# Altium footprint library Package_DFN_QFN.PcbLib: 557 footprints (part 16 of 35)
Each footprint in its own frame and in the unit in brackets; x right, y up, seen from the top. Pads: shape width x height; smd on the part's side, far side on the other; paste and mask are expansions set on the pad; w line width, h text height; cw(c..) or ccw(c..) is an arc to the next point about the centre after c.
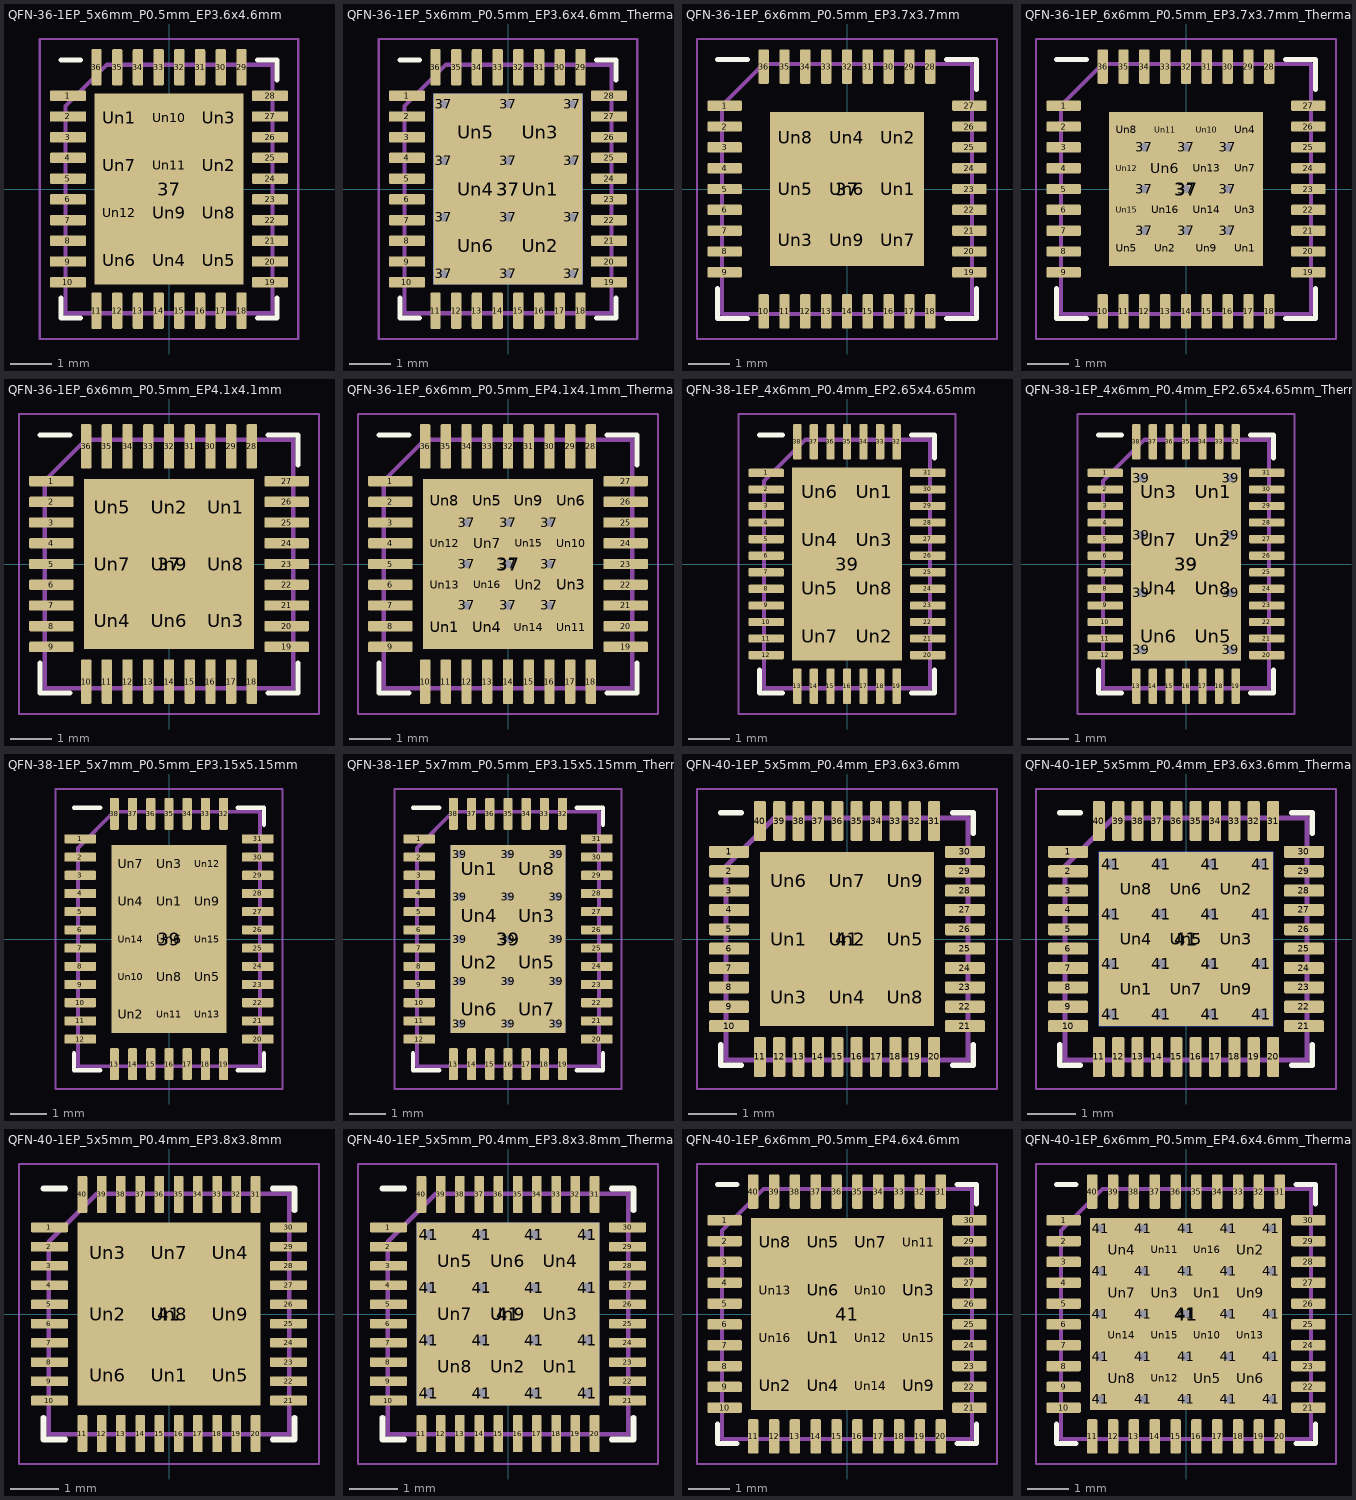
[diagram p15: the footprints below, top view; thin cyan lines are the x and y axes]

## QFN-36-1EP_5x6mm_P0.5mm_EP3.6x4.6mm [mm]
pads (49):
  rrect25% 0.875x0.25 smd: 1(-2.438,2.25) 2(-2.438,1.75) 3(-2.438,1.25) 4(-2.438,0.75) 5(-2.438,0.25) 6(-2.438,-0.25) 7(-2.438,-0.75) 8(-2.438,-1.25) 9(-2.438,-1.75) 10(-2.438,-2.25) 19(2.438,-2.25) 20(2.438,-1.75) 21(2.438,-1.25) 22(2.438,-0.75) 23(2.438,-0.25) 24(2.438,0.25) 25(2.438,0.75) 26(2.438,1.25) 27(2.438,1.75) 28(2.438,2.25)
  rrect25% 0.25x0.875 smd: 11(-1.75,-2.937) 12(-1.25,-2.937) 13(-0.75,-2.937) 14(-0.25,-2.937) 15(0.25,-2.937) 16(0.75,-2.937) 17(1.25,-2.937) 18(1.75,-2.937) 29(1.75,2.937) 30(1.25,2.937) 31(0.75,2.937) 32(0.25,2.937) 33(-0.25,2.937) 34(-0.75,2.937) 35(-1.25,2.937) 36(-1.75,2.937)
  rect 3.6x4.6 smd: 37(0,0)
  rrect25% 0.97x0.93 on Top Paste: Un1(-1.2,1.725) Un2(1.2,0.575) Un3(1.2,1.725) Un4(0,-1.725) Un5(1.2,-1.725) Un6(-1.2,-1.725) Un7(-1.2,0.575) Un8(1.2,-0.575) Un9(0,-0.575) Un10(0,1.725) Un11(0,0.575) Un12(-1.2,-0.575)
F.SilkS:
  lines w0.12: -2.61,-2.635 -2.61,-3.11 -2.135,-3.11 ; -2.61,3.11 -2.135,3.11 ; 2.135,-3.11 2.61,-3.11 2.61,-2.635 ; 2.135,3.11 2.61,3.11 2.61,2.635
F.CrtYd:
  lines w0.05: -3.12,-3.62 3.12,-3.62 3.12,3.62 -3.12,3.62 -3.12,-3.62
F.Fab:
  lines w0.1: -2.5,-3 2.5,-3 2.5,3 -1.5,3 -2.5,2 -2.5,-3
  text "'.Designator'" at -4.047,-0.84 h1

## QFN-36-1EP_5x6mm_P0.5mm_EP3.6x4.6mm_ThermalVias [mm]
pads (56):
  rrect25% 0.875x0.25 smd: 1(-2.438,2.25) 2(-2.438,1.75) 3(-2.438,1.25) 4(-2.438,0.75) 5(-2.438,0.25) 6(-2.438,-0.25) 7(-2.438,-0.75) 8(-2.438,-1.25) 9(-2.438,-1.75) 10(-2.438,-2.25) 19(2.438,-2.25) 20(2.438,-1.75) 21(2.438,-1.25) 22(2.438,-0.75) 23(2.438,-0.25) 24(2.438,0.25) 25(2.438,0.75) 26(2.438,1.25) 27(2.438,1.75) 28(2.438,2.25)
  rrect25% 0.25x0.875 smd: 11(-1.75,-2.937) 12(-1.25,-2.937) 13(-0.75,-2.937) 14(-0.25,-2.937) 15(0.25,-2.937) 16(0.75,-2.937) 17(1.25,-2.937) 18(1.75,-2.937) 29(1.75,2.937) 30(1.25,2.937) 31(0.75,2.937) 32(0.25,2.937) 33(-0.25,2.937) 34(-0.75,2.937) 35(-1.25,2.937) 36(-1.75,2.937)
  round 0.5 hole 0.2: 37(-1.55,-2.05) 37(-1.55,-0.683) 37(-1.55,0.683) 37(-1.55,2.05) 37(0,-2.05) 37(0,-0.683) 37(0,0.683) 37(0,2.05) 37(1.55,-2.05) 37(1.55,-0.683) 37(1.55,0.683) 37(1.55,2.05)
  rect 3.6x4.6 smd far side: 37(0,0)
  rect 3.6x4.6 smd: 37(0,0)
  rrect21% 1.394x1.188 on Top Paste: Un1(0.775,0) Un2(0.775,-1.367) Un3(0.775,1.367) Un4(-0.775,0) Un5(-0.775,1.367) Un6(-0.775,-1.367)
F.SilkS:
  lines w0.12: -2.61,-2.635 -2.61,-3.11 -2.135,-3.11 ; -2.61,3.11 -2.135,3.11 ; 2.135,-3.11 2.61,-3.11 2.61,-2.635 ; 2.135,3.11 2.61,3.11 2.61,2.635
F.CrtYd:
  lines w0.05: -3.12,-3.62 -3.12,3.62 3.12,3.62 3.12,-3.62 -3.12,-3.62
F.Fab:
  lines w0.1: -2.5,-3 -2.5,2 -1.5,3 2.5,3 2.5,-3 -2.5,-3
  text "'.Designator'" at -4.047,-0.84 h1

## QFN-36-1EP_6x6mm_P0.5mm_EP3.7x3.7mm [mm]
pads (46):
  rrect25% 0.825x0.25 smd: 1(-2.937,2) 2(-2.937,1.5) 3(-2.937,1) 4(-2.937,0.5) 5(-2.937,0) 6(-2.937,-0.5) 7(-2.937,-1) 8(-2.937,-1.5) 9(-2.937,-2) 19(2.937,-2) 20(2.937,-1.5) 21(2.937,-1) 22(2.937,-0.5) 23(2.937,0) 24(2.937,0.5) 25(2.937,1) 26(2.937,1.5) 27(2.937,2)
  rrect25% 0.25x0.825 smd: 10(-2,-2.937) 11(-1.5,-2.937) 12(-1,-2.937) 13(-0.5,-2.937) 14(0,-2.937) 15(0.5,-2.937) 16(1,-2.937) 17(1.5,-2.937) 18(2,-2.937) 28(2,2.937) 29(1.5,2.937) 30(1,2.937) 31(0.5,2.937) 32(0,2.937) 33(-0.5,2.937) 34(-1,2.937) 35(-1.5,2.937) 36(-2,2.937)
  rect 3.7x3.7 smd: 37(0,0)
  rrect25% 0.99x0.99 on Top Paste: Un1(1.23,0) Un2(1.23,1.23) Un3(-1.23,-1.23) Un4(0,1.23) Un5(-1.23,0) Un6(0,0) Un7(1.23,-1.23) Un8(-1.23,1.23) Un9(0,-1.23)
F.SilkS:
  lines w0.12: -3.11,-2.385 -3.11,-3.11 -2.385,-3.11 ; -3.11,3.11 -2.385,3.11 ; 2.385,-3.11 3.11,-3.11 3.11,-2.385 ; 2.385,3.11 3.11,3.11 3.11,2.385
F.CrtYd:
  lines w0.05: -3.6,-3.6 3.6,-3.6 3.6,3.6 -3.6,3.6 -3.6,-3.6
F.Fab:
  lines w0.1: -3,-3 -3,2 -2,3 3,3 3,-3 -3,-3
  text "'.Designator'" at -4.047,-0.84 h1

## QFN-36-1EP_6x6mm_P0.5mm_EP3.7x3.7mm_ThermalVias [mm]
pads (63):
  rrect25% 0.825x0.25 smd: 1(-2.937,2) 2(-2.937,1.5) 3(-2.937,1) 4(-2.937,0.5) 5(-2.937,0) 6(-2.937,-0.5) 7(-2.937,-1) 8(-2.937,-1.5) 9(-2.937,-2) 19(2.937,-2) 20(2.937,-1.5) 21(2.937,-1) 22(2.937,-0.5) 23(2.937,0) 24(2.937,0.5) 25(2.937,1) 26(2.937,1.5) 27(2.937,2)
  rrect25% 0.25x0.825 smd: 10(-2,-2.937) 11(-1.5,-2.937) 12(-1,-2.937) 13(-0.5,-2.937) 14(0,-2.937) 15(0.5,-2.937) 16(1,-2.937) 17(1.5,-2.937) 18(2,-2.937) 28(2,2.937) 29(1.5,2.937) 30(1,2.937) 31(0.5,2.937) 32(0,2.937) 33(-0.5,2.937) 34(-1,2.937) 35(-1.5,2.937) 36(-2,2.937)
  round 0.5 hole 0.2: 37(-1,-1) 37(-1,0) 37(-1,1) 37(0,-1) 37(0,0) 37(0,1) 37(1,-1) 37(1,0) 37(1,1)
  rect 3.7x3.7 smd: 37(0,0)
  rect 2.5x2.5 smd far side: 37(0,0)
  round 0.602 on Top Paste: Un1(1.425,-1.425) Un4(1.425,1.425) Un5(-1.425,-1.425) Un8(-1.425,1.425)
  round 0.612 on Top Paste: Un2(-0.5,-1.425) Un3(1.425,-0.5) Un7(1.425,0.5) Un9(0.5,-1.425) Un10(0.5,1.425) Un11(-0.5,1.425) Un12(-1.425,0.5) Un15(-1.425,-0.5)
  rrect25% 0.806x0.806 on Top Paste: Un6(-0.5,0.5) Un13(0.5,0.5) Un14(0.5,-0.5) Un16(-0.5,-0.5)
F.SilkS:
  lines w0.12: -3.11,-2.385 -3.11,-3.11 -2.385,-3.11 ; -3.11,3.11 -2.385,3.11 ; 2.385,-3.11 3.11,-3.11 3.11,-2.385 ; 2.385,3.11 3.11,3.11 3.11,2.385
F.Paste:
  region: 1.684,-1.684 1.166,-1.684 1.166,-1.235 1.235,-1.166 1.684,-1.166
  region: -0.17,-1.216 -0.17,-1.694 -0.83,-1.694 -0.83,-1.216 -0.769,-1.156 -0.231,-1.156
  region: 1.694,-0.83 1.216,-0.83 1.156,-0.769 1.156,-0.231 1.216,-0.17 1.694,-0.17
  region: 1.684,1.166 1.235,1.166 1.166,1.235 1.166,1.684 1.684,1.684
  region: -1.166,-1.235 -1.166,-1.684 -1.684,-1.684 -1.684,-1.166 -1.235,-1.166
  region: 1.694,0.17 1.216,0.17 1.156,0.231 1.156,0.769 1.216,0.83 1.694,0.83
  region: -1.166,1.235 -1.235,1.166 -1.684,1.166 -1.684,1.684 -1.166,1.684
  region: 0.83,-1.216 0.83,-1.694 0.17,-1.694 0.17,-1.216 0.231,-1.156 0.769,-1.156
  region: 0.83,1.216 0.769,1.156 0.231,1.156 0.17,1.216 0.17,1.694 0.83,1.694
  region: -0.17,1.216 -0.231,1.156 -0.769,1.156 -0.83,1.216 -0.83,1.694 -0.17,1.694
  region: -1.156,0.769 -1.156,0.231 -1.216,0.17 -1.694,0.17 -1.694,0.83 -1.216,0.83
  region: -1.156,-0.231 -1.156,-0.769 -1.216,-0.83 -1.694,-0.83 -1.694,-0.17 -1.216,-0.17
F.CrtYd:
  lines w0.05: -3.6,-3.6 -3.6,3.6 3.6,3.6 3.6,-3.6 -3.6,-3.6
F.Fab:
  lines w0.1: -3,-3 -3,2 -2,3 3,3 3,-3 -3,-3
  text "'.Designator'" at -4.047,-0.84 h1

## QFN-36-1EP_6x6mm_P0.5mm_EP4.1x4.1mm [mm]
pads (46):
  rrect25% 1.075x0.25 smd: 1(-2.838,2) 2(-2.838,1.5) 3(-2.838,1) 4(-2.838,0.5) 5(-2.838,0) 6(-2.838,-0.5) 7(-2.838,-1) 8(-2.838,-1.5) 9(-2.838,-2) 19(2.838,-2) 20(2.838,-1.5) 21(2.838,-1) 22(2.838,-0.5) 23(2.838,0) 24(2.838,0.5) 25(2.838,1) 26(2.838,1.5) 27(2.838,2)
  rrect25% 0.25x1.075 smd: 10(-2,-2.838) 11(-1.5,-2.838) 12(-1,-2.838) 13(-0.5,-2.838) 14(0,-2.838) 15(0.5,-2.838) 16(1,-2.838) 17(1.5,-2.838) 18(2,-2.838) 28(2,2.838) 29(1.5,2.838) 30(1,2.838) 31(0.5,2.838) 32(0,2.838) 33(-0.5,2.838) 34(-1,2.838) 35(-1.5,2.838) 36(-2,2.838)
  rect 4.1x4.1 smd: 37(0,0)
  rrect23% 1.1x1.1 on Top Paste: Un1(1.37,1.37) Un2(0,1.37) Un3(1.37,-1.37) Un4(-1.37,-1.37) Un5(-1.37,1.37) Un6(0,-1.37) Un7(-1.37,0) Un8(1.37,0) Un9(0,0)
F.SilkS:
  lines w0.12: -3.11,-2.385 -3.11,-3.11 -2.385,-3.11 ; -3.11,3.11 -2.385,3.11 ; 2.385,-3.11 3.11,-3.11 3.11,-2.385 ; 2.385,3.11 3.11,3.11 3.11,2.385
F.CrtYd:
  lines w0.05: -3.62,-3.62 3.62,-3.62 3.62,3.62 -3.62,3.62 -3.62,-3.62
F.Fab:
  lines w0.1: -3,-3 3,-3 3,3 -2,3 -3,2 -3,-3
  text "'.Designator'" at -4.047,-0.84 h1

## QFN-36-1EP_6x6mm_P0.5mm_EP4.1x4.1mm_ThermalVias [mm]
pads (63):
  rrect25% 1.075x0.25 smd: 1(-2.838,2) 2(-2.838,1.5) 3(-2.838,1) 4(-2.838,0.5) 5(-2.838,0) 6(-2.838,-0.5) 7(-2.838,-1) 8(-2.838,-1.5) 9(-2.838,-2) 19(2.838,-2) 20(2.838,-1.5) 21(2.838,-1) 22(2.838,-0.5) 23(2.838,0) 24(2.838,0.5) 25(2.838,1) 26(2.838,1.5) 27(2.838,2)
  rrect25% 0.25x1.075 smd: 10(-2,-2.838) 11(-1.5,-2.838) 12(-1,-2.838) 13(-0.5,-2.838) 14(0,-2.838) 15(0.5,-2.838) 16(1,-2.838) 17(1.5,-2.838) 18(2,-2.838) 28(2,2.838) 29(1.5,2.838) 30(1,2.838) 31(0.5,2.838) 32(0,2.838) 33(-0.5,2.838) 34(-1,2.838) 35(-1.5,2.838) 36(-2,2.838)
  round 0.5 hole 0.2: 37(-1,-1) 37(-1,0) 37(-1,1) 37(0,-1) 37(0,0) 37(0,1) 37(1,-1) 37(1,0) 37(1,1)
  rect 4.1x4.1 smd: 37(0,0)
  rect 2.5x2.5 smd far side: 37(0,0)
  rrect25% 0.847x0.847 on Top Paste: Un1(-1.525,-1.525) Un6(1.525,1.525) Un8(-1.525,1.525) Un11(1.525,-1.525)
  rrect25% 0.806x0.806 on Top Paste: Un2(0.5,-0.5) Un7(-0.5,0.5) Un15(0.5,0.5) Un16(-0.5,-0.5)
  rrect25% 0.847x0.806 on Top Paste: Un3(1.525,-0.5) Un10(1.525,0.5) Un12(-1.525,0.5) Un13(-1.525,-0.5)
  rrect25% 0.806x0.847 on Top Paste: Un4(-0.5,-1.525) Un5(-0.5,1.525) Un9(0.5,1.525) Un14(0.5,-1.525)
F.SilkS:
  lines w0.12: -3.11,-2.385 -3.11,-3.11 -2.385,-3.11 ; -3.11,3.11 -2.385,3.11 ; 2.385,-3.11 3.11,-3.11 3.11,-2.385 ; 2.385,3.11 3.11,3.11 3.11,2.385
F.CrtYd:
  lines w0.05: -3.62,-3.62 3.62,-3.62 3.62,3.62 -3.62,3.62 -3.62,-3.62
F.Fab:
  lines w0.1: -3,-3 3,-3 3,3 -2,3 -3,2 -3,-3
  text "'.Designator'" at -4.047,-0.84 h1

## QFN-38-1EP_4x6mm_P0.4mm_EP2.65x4.65mm [mm]
pads (47):
  rrect25% 0.85x0.2 smd: 1(-1.95,2.2) 2(-1.95,1.8) 3(-1.95,1.4) 4(-1.95,1) 5(-1.95,0.6) 6(-1.95,0.2) 7(-1.95,-0.2) 8(-1.95,-0.6) 9(-1.95,-1) 10(-1.95,-1.4) 11(-1.95,-1.8) 12(-1.95,-2.2) 20(1.95,-2.2) 21(1.95,-1.8) 22(1.95,-1.4) 23(1.95,-1) 24(1.95,-0.6) 25(1.95,-0.2) 26(1.95,0.2) 27(1.95,0.6) 28(1.95,1) 29(1.95,1.4) 30(1.95,1.8) 31(1.95,2.2)
  rrect25% 0.2x0.85 smd: 13(-1.2,-2.95) 14(-0.8,-2.95) 15(-0.4,-2.95) 16(0,-2.95) 17(0.4,-2.95) 18(0.8,-2.95) 19(1.2,-2.95) 32(1.2,2.95) 33(0.8,2.95) 34(0.4,2.95) 35(0,2.95) 36(-0.4,2.95) 37(-0.8,2.95) 38(-1.2,2.95)
  rect 2.65x4.65 smd: 39(0,0)
  rrect25% 1.07x0.94 on Top Paste: Un1(0.66,1.74) Un2(0.66,-1.74) Un3(0.66,0.58) Un4(-0.66,0.58) Un5(-0.66,-0.58) Un6(-0.66,1.74) Un7(-0.66,-1.74) Un8(0.66,-0.58)
F.SilkS:
  lines w0.12: -2.11,-2.56 -2.11,-3.11 -1.56,-3.11 ; -2.11,3.11 -1.56,3.11 ; 1.56,-3.11 2.11,-3.11 2.11,-2.56 ; 1.56,3.11 2.11,3.11 2.11,2.56
F.CrtYd:
  lines w0.05: -2.62,-3.62 2.62,-3.62 2.62,3.62 -2.62,3.62 -2.62,-3.62
F.Fab:
  lines w0.1: -2,-3 2,-3 2,3 -1,3 -2,2 -2,-3
  text "'.Designator'" at -4.047,-0.84 h1

## QFN-38-1EP_4x6mm_P0.4mm_EP2.65x4.65mm_ThermalVias [mm]
pads (56):
  rrect25% 0.85x0.2 smd: 1(-1.95,2.2) 2(-1.95,1.8) 3(-1.95,1.4) 4(-1.95,1) 5(-1.95,0.6) 6(-1.95,0.2) 7(-1.95,-0.2) 8(-1.95,-0.6) 9(-1.95,-1) 10(-1.95,-1.4) 11(-1.95,-1.8) 12(-1.95,-2.2) 20(1.95,-2.2) 21(1.95,-1.8) 22(1.95,-1.4) 23(1.95,-1) 24(1.95,-0.6) 25(1.95,-0.2) 26(1.95,0.2) 27(1.95,0.6) 28(1.95,1) 29(1.95,1.4) 30(1.95,1.8) 31(1.95,2.2)
  rrect25% 0.2x0.85 smd: 13(-1.2,-2.95) 14(-0.8,-2.95) 15(-0.4,-2.95) 16(0,-2.95) 17(0.4,-2.95) 18(0.8,-2.95) 19(1.2,-2.95) 32(1.2,2.95) 33(0.8,2.95) 34(0.4,2.95) 35(0,2.95) 36(-0.4,2.95) 37(-0.8,2.95) 38(-1.2,2.95)
  round 0.5 hole 0.2: 39(-1.075,-2.075) 39(-1.075,-0.692) 39(-1.075,0.692) 39(-1.075,2.075) 39(1.075,-2.075) 39(1.075,-0.692) 39(1.075,0.692) 39(1.075,2.075)
  rect 2.65x4.65 smd far side: 39(0,0)
  rect 2.65x4.65 smd: 39(0,0)
  rrect25% 1.15x1.01 on Top Paste: Un1(0.66,1.74) Un2(0.66,0.58) Un3(-0.66,1.74) Un4(-0.66,-0.58) Un5(0.66,-1.74) Un6(-0.66,-1.74) Un7(-0.66,0.58) Un8(0.66,-0.58)
F.SilkS:
  lines w0.12: -2.11,-2.56 -2.11,-3.11 -1.56,-3.11 ; -2.11,3.11 -1.56,3.11 ; 1.56,-3.11 2.11,-3.11 2.11,-2.56 ; 1.56,3.11 2.11,3.11 2.11,2.56
F.CrtYd:
  lines w0.05: -2.62,-3.62 -2.62,3.62 2.62,3.62 2.62,-3.62 -2.62,-3.62
F.Fab:
  lines w0.1: -2,-3 -2,2 -1,3 2,3 2,-3 -2,-3
  text "'.Designator'" at -4.047,-0.84 h1

## QFN-38-1EP_5x7mm_P0.5mm_EP3.15x5.15mm [mm]
pads (54):
  rrect25% 0.875x0.25 smd: 1(-2.438,2.75) 2(-2.438,2.25) 3(-2.438,1.75) 4(-2.438,1.25) 5(-2.438,0.75) 6(-2.438,0.25) 7(-2.438,-0.25) 8(-2.438,-0.75) 9(-2.438,-1.25) 10(-2.438,-1.75) 11(-2.438,-2.25) 12(-2.438,-2.75) 20(2.438,-2.75) 21(2.438,-2.25) 22(2.438,-1.75) 23(2.438,-1.25) 24(2.438,-0.75) 25(2.438,-0.25) 26(2.438,0.25) 27(2.438,0.75) 28(2.438,1.25) 29(2.438,1.75) 30(2.438,2.25) 31(2.438,2.75)
  rrect25% 0.25x0.875 smd: 13(-1.5,-3.437) 14(-1,-3.437) 15(-0.5,-3.437) 16(0,-3.437) 17(0.5,-3.437) 18(1,-3.437) 19(1.5,-3.437) 32(1.5,3.437) 33(1,3.437) 34(0.5,3.437) 35(0,3.437) 36(-0.5,3.437) 37(-1,3.437) 38(-1.5,3.437)
  rect 3.15x5.15 smd: 39(0,0)
  rrect25% 0.85x0.83 on Top Paste: Un1(0,1.03) Un2(-1.05,-2.06) Un3(0,2.06) Un4(-1.05,1.03) Un5(1.05,-1.03) Un6(0,0) Un7(-1.05,2.06) Un8(0,-1.03) Un9(1.05,1.03) Un10(-1.05,-1.03) Un11(0,-2.06) Un12(1.05,2.06) Un13(1.05,-2.06) Un14(-1.05,0) Un15(1.05,0)
F.SilkS:
  lines w0.12: -2.61,-3.135 -2.61,-3.61 -1.885,-3.61 ; -2.61,3.61 -1.885,3.61 ; 1.885,-3.61 2.61,-3.61 2.61,-3.135 ; 1.885,3.61 2.61,3.61 2.61,3.135
F.CrtYd:
  lines w0.05: -3.12,-4.12 -3.12,4.12 3.12,4.12 3.12,-4.12 -3.12,-4.12
F.Fab:
  lines w0.1: -2.5,-3.5 2.5,-3.5 2.5,3.5 -1.5,3.5 -2.5,2.5 -2.5,-3.5
  text "'.Designator'" at -4.047,-0.84 h1

## QFN-38-1EP_5x7mm_P0.5mm_EP3.15x5.15mm_ThermalVias [mm]
pads (63):
  rrect25% 0.875x0.25 smd: 1(-2.438,2.75) 2(-2.438,2.25) 3(-2.438,1.75) 4(-2.438,1.25) 5(-2.438,0.75) 6(-2.438,0.25) 7(-2.438,-0.25) 8(-2.438,-0.75) 9(-2.438,-1.25) 10(-2.438,-1.75) 11(-2.438,-2.25) 12(-2.438,-2.75) 20(2.438,-2.75) 21(2.438,-2.25) 22(2.438,-1.75) 23(2.438,-1.25) 24(2.438,-0.75) 25(2.438,-0.25) 26(2.438,0.25) 27(2.438,0.75) 28(2.438,1.25) 29(2.438,1.75) 30(2.438,2.25) 31(2.438,2.75)
  rrect25% 0.25x0.875 smd: 13(-1.5,-3.437) 14(-1,-3.437) 15(-0.5,-3.437) 16(0,-3.437) 17(0.5,-3.437) 18(1,-3.437) 19(1.5,-3.437) 32(1.5,3.437) 33(1,3.437) 34(0.5,3.437) 35(0,3.437) 36(-0.5,3.437) 37(-1,3.437) 38(-1.5,3.437)
  round 0.5 hole 0.2: 39(-1.325,-2.325) 39(-1.325,-1.162) 39(-1.325,0) 39(-1.325,1.162) 39(-1.325,2.325) 39(0,-2.325) 39(0,-1.162) 39(0,0) 39(0,1.162) 39(0,2.325) 39(1.325,-2.325) 39(1.325,-1.162) 39(1.325,0) 39(1.325,1.162) 39(1.325,2.325)
  rect 3.15x5.15 smd far side: 39(0,0)
  rect 3.15x5.15 smd: 39(0,0)
  rrect22% 1.36x1.12 on Top Paste: Un1(-0.79,1.935) Un2(-0.79,-0.645) Un3(0.79,0.645) Un4(-0.79,0.645) Un5(0.79,-0.645) Un6(-0.79,-1.935) Un7(0.79,-1.935) Un8(0.79,1.935)
F.SilkS:
  lines w0.12: -2.61,-3.135 -2.61,-3.61 -1.885,-3.61 ; -2.61,3.61 -1.885,3.61 ; 1.885,-3.61 2.61,-3.61 2.61,-3.135 ; 1.885,3.61 2.61,3.61 2.61,3.135
F.CrtYd:
  lines w0.05: -3.12,-4.12 -3.12,4.12 3.12,4.12 3.12,-4.12 -3.12,-4.12
F.Fab:
  lines w0.1: -2.5,-3.5 -2.5,2.5 -1.5,3.5 2.5,3.5 2.5,-3.5 -2.5,-3.5
  text "'.Designator'" at -4.047,-0.84 h1

## QFN-40-1EP_5x5mm_P0.4mm_EP3.6x3.6mm [mm]
pads (50):
  rrect25% 0.825x0.25 smd: 1(-2.438,1.8) 2(-2.438,1.4) 3(-2.438,1) 4(-2.438,0.6) 5(-2.438,0.2) 6(-2.438,-0.2) 7(-2.438,-0.6) 8(-2.438,-1) 9(-2.438,-1.4) 10(-2.438,-1.8) 21(2.438,-1.8) 22(2.438,-1.4) 23(2.438,-1) 24(2.438,-0.6) 25(2.438,-0.2) 26(2.438,0.2) 27(2.438,0.6) 28(2.438,1) 29(2.438,1.4) 30(2.438,1.8)
  rrect25% 0.25x0.825 smd: 11(-1.8,-2.438) 12(-1.4,-2.438) 13(-1,-2.438) 14(-0.6,-2.438) 15(-0.2,-2.438) 16(0.2,-2.438) 17(0.6,-2.438) 18(1,-2.438) 19(1.4,-2.438) 20(1.8,-2.438) 31(1.8,2.438) 32(1.4,2.438) 33(1,2.438) 34(0.6,2.438) 35(0.2,2.438) 36(-0.2,2.438) 37(-0.6,2.438) 38(-1,2.438) 39(-1.4,2.438) 40(-1.8,2.438)
  rect 3.6x3.6 smd: 41(0,0)
  rrect25% 0.97x0.97 on Top Paste: Un1(-1.2,0) Un2(0,0) Un3(-1.2,-1.2) Un4(0,-1.2) Un5(1.2,0) Un6(-1.2,1.2) Un7(0,1.2) Un8(1.2,-1.2) Un9(1.2,1.2)
F.SilkS:
  lines w0.12: -2.61,-2.185 -2.61,-2.61 -2.185,-2.61 ; -2.61,2.61 -2.185,2.61 ; 2.185,-2.61 2.61,-2.61 2.61,-2.185 ; 2.185,2.61 2.61,2.61 2.61,2.185
F.CrtYd:
  lines w0.05: -3.1,-3.1 3.1,-3.1 3.1,3.1 -3.1,3.1 -3.1,-3.1
F.Fab:
  lines w0.1: -2.5,-2.5 2.5,-2.5 2.5,2.5 -1.5,2.5 -2.5,1.5 -2.5,-2.5
  text "'.Designator'" at -4.047,-0.84 h1

## QFN-40-1EP_5x5mm_P0.4mm_EP3.6x3.6mm_ThermalVias [mm]
pads (67):
  rrect25% 0.825x0.25 smd: 1(-2.438,1.8) 2(-2.438,1.4) 3(-2.438,1) 4(-2.438,0.6) 5(-2.438,0.2) 6(-2.438,-0.2) 7(-2.438,-0.6) 8(-2.438,-1) 9(-2.438,-1.4) 10(-2.438,-1.8) 21(2.438,-1.8) 22(2.438,-1.4) 23(2.438,-1) 24(2.438,-0.6) 25(2.438,-0.2) 26(2.438,0.2) 27(2.438,0.6) 28(2.438,1) 29(2.438,1.4) 30(2.438,1.8)
  rrect25% 0.25x0.825 smd: 11(-1.8,-2.438) 12(-1.4,-2.438) 13(-1,-2.438) 14(-0.6,-2.438) 15(-0.2,-2.438) 16(0.2,-2.438) 17(0.6,-2.438) 18(1,-2.438) 19(1.4,-2.438) 20(1.8,-2.438) 31(1.8,2.438) 32(1.4,2.438) 33(1,2.438) 34(0.6,2.438) 35(0.2,2.438) 36(-0.2,2.438) 37(-0.6,2.438) 38(-1,2.438) 39(-1.4,2.438) 40(-1.8,2.438)
  round 0.5 hole 0.2: 41(-1.55,-1.55) 41(-1.55,-0.517) 41(-1.55,0.517) 41(-1.55,1.55) 41(-0.517,-1.55) 41(-0.517,-0.517) 41(-0.517,0.517) 41(-0.517,1.55) 41(0.517,-1.55) 41(0.517,-0.517) 41(0.517,0.517) 41(0.517,1.55) 41(1.55,-1.55) 41(1.55,-0.517) 41(1.55,0.517) 41(1.55,1.55)
  rect 3.6x3.6 smd far side: 41(0,0)
  rect 3.6x3.6 smd: 41(0,0)
  round 0.803 on Top Paste: Un1(-1.033,-1.033) Un2(1.033,1.033) Un3(1.033,0) Un4(-1.033,0) Un5(0,0) Un6(0,1.033) Un7(0,-1.033) Un8(-1.033,1.033) Un9(1.033,-1.033)
F.SilkS:
  lines w0.12: -2.61,-2.185 -2.61,-2.61 -2.185,-2.61 ; -2.61,2.61 -2.185,2.61 ; 2.185,-2.61 2.61,-2.61 2.61,-2.185 ; 2.185,2.61 2.61,2.61 2.61,2.185
F.Paste:
  region: -0.695,-0.8 -0.695,-1.267 -0.8,-1.372 -1.267,-1.372 -1.372,-1.267 -1.372,-0.8 -1.267,-0.695 -0.8,-0.695
  region: 1.372,1.267 1.372,0.8 1.267,0.695 0.8,0.695 0.695,0.8 0.695,1.267 0.8,1.372 1.267,1.372
  region: 1.372,0.233 1.372,-0.233 1.267,-0.338 0.8,-0.338 0.695,-0.233 0.695,0.233 0.8,0.338 1.267,0.338
  region: -0.695,0.233 -0.695,-0.233 -0.8,-0.338 -1.267,-0.338 -1.372,-0.233 -1.372,0.233 -1.267,0.338 -0.8,0.338
  region: 0.338,0.233 0.338,-0.233 0.233,-0.338 -0.233,-0.338 -0.338,-0.233 -0.338,0.233 -0.233,0.338 0.233,0.338
  region: 0.338,1.267 0.338,0.8 0.233,0.695 -0.233,0.695 -0.338,0.8 -0.338,1.267 -0.233,1.372 0.233,1.372
  region: 0.338,-0.8 0.338,-1.267 0.233,-1.372 -0.233,-1.372 -0.338,-1.267 -0.338,-0.8 -0.233,-0.695 0.233,-0.695
  region: -0.695,1.267 -0.695,0.8 -0.8,0.695 -1.267,0.695 -1.372,0.8 -1.372,1.267 -1.267,1.372 -0.8,1.372
  region: 1.372,-0.8 1.372,-1.267 1.267,-1.372 0.8,-1.372 0.695,-1.267 0.695,-0.8 0.8,-0.695 1.267,-0.695
F.CrtYd:
  lines w0.05: -3.1,-3.1 -3.1,3.1 3.1,3.1 3.1,-3.1 -3.1,-3.1
F.Fab:
  lines w0.1: -2.5,-2.5 -2.5,1.5 -1.5,2.5 2.5,2.5 2.5,-2.5 -2.5,-2.5
  text "'.Designator'" at -4.047,-0.84 h1

## QFN-40-1EP_5x5mm_P0.4mm_EP3.8x3.8mm [mm]
pads (50):
  rrect25% 0.775x0.2 smd: 1(-2.488,1.8) 2(-2.488,1.4) 3(-2.488,1) 4(-2.488,0.6) 5(-2.488,0.2) 6(-2.488,-0.2) 7(-2.488,-0.6) 8(-2.488,-1) 9(-2.488,-1.4) 10(-2.488,-1.8) 21(2.488,-1.8) 22(2.488,-1.4) 23(2.488,-1) 24(2.488,-0.6) 25(2.488,-0.2) 26(2.488,0.2) 27(2.488,0.6) 28(2.488,1) 29(2.488,1.4) 30(2.488,1.8)
  rrect25% 0.2x0.775 smd: 11(-1.8,-2.488) 12(-1.4,-2.488) 13(-1,-2.488) 14(-0.6,-2.488) 15(-0.2,-2.488) 16(0.2,-2.488) 17(0.6,-2.488) 18(1,-2.488) 19(1.4,-2.488) 20(1.8,-2.488) 31(1.8,2.488) 32(1.4,2.488) 33(1,2.488) 34(0.6,2.488) 35(0.2,2.488) 36(-0.2,2.488) 37(-0.6,2.488) 38(-1,2.488) 39(-1.4,2.488) 40(-1.8,2.488)
  rect 3.8x3.8 smd: 41(0,0)
  rrect25% 1.02x1.02 on Top Paste: Un1(0,-1.27) Un2(-1.27,0) Un3(-1.27,1.27) Un4(1.27,1.27) Un5(1.27,-1.27) Un6(-1.27,-1.27) Un7(0,1.27) Un8(0,0) Un9(1.27,0)
F.SilkS:
  lines w0.12: -2.61,-2.16 -2.61,-2.61 -2.16,-2.61 ; -2.61,2.61 -2.16,2.61 ; 2.16,-2.61 2.61,-2.61 2.61,-2.16 ; 2.16,2.61 2.61,2.61 2.61,2.16
F.CrtYd:
  lines w0.05: -3.12,-3.12 3.12,-3.12 3.12,3.12 -3.12,3.12 -3.12,-3.12
F.Fab:
  lines w0.1: -2.5,-2.5 2.5,-2.5 2.5,2.5 -1.5,2.5 -2.5,1.5 -2.5,-2.5
  text "'.Designator'" at -4.047,-0.84 h1

## QFN-40-1EP_5x5mm_P0.4mm_EP3.8x3.8mm_ThermalVias [mm]
pads (67):
  rrect25% 0.775x0.2 smd: 1(-2.488,1.8) 2(-2.488,1.4) 3(-2.488,1) 4(-2.488,0.6) 5(-2.488,0.2) 6(-2.488,-0.2) 7(-2.488,-0.6) 8(-2.488,-1) 9(-2.488,-1.4) 10(-2.488,-1.8) 21(2.488,-1.8) 22(2.488,-1.4) 23(2.488,-1) 24(2.488,-0.6) 25(2.488,-0.2) 26(2.488,0.2) 27(2.488,0.6) 28(2.488,1) 29(2.488,1.4) 30(2.488,1.8)
  rrect25% 0.2x0.775 smd: 11(-1.8,-2.488) 12(-1.4,-2.488) 13(-1,-2.488) 14(-0.6,-2.488) 15(-0.2,-2.488) 16(0.2,-2.488) 17(0.6,-2.488) 18(1,-2.488) 19(1.4,-2.488) 20(1.8,-2.488) 31(1.8,2.488) 32(1.4,2.488) 33(1,2.488) 34(0.6,2.488) 35(0.2,2.488) 36(-0.2,2.488) 37(-0.6,2.488) 38(-1,2.488) 39(-1.4,2.488) 40(-1.8,2.488)
  round 0.5 hole 0.2: 41(-1.65,-1.65) 41(-1.65,-0.55) 41(-1.65,0.55) 41(-1.65,1.65) 41(-0.55,-1.65) 41(-0.55,-0.55) 41(-0.55,0.55) 41(-0.55,1.65) 41(0.55,-1.65) 41(0.55,-0.55) 41(0.55,0.55) 41(0.55,1.65) 41(1.65,-1.65) 41(1.65,-0.55) 41(1.65,0.55) 41(1.65,1.65)
  rect 3.8x3.8 smd far side: 41(0,0)
  rect 3.8x3.8 smd: 41(0,0)
  round 0.865 on Top Paste: Un1(1.1,-1.1) Un2(0,-1.1) Un3(1.1,0) Un4(1.1,1.1) Un5(-1.1,1.1) Un6(0,1.1) Un7(-1.1,0) Un8(-1.1,-1.1) Un9(0,0)
F.SilkS:
  lines w0.12: -2.61,-2.16 -2.61,-2.61 -2.16,-2.61 ; -2.61,2.61 -2.16,2.61 ; 2.16,-2.61 2.61,-2.61 2.61,-2.16 ; 2.16,2.61 2.61,2.61 2.61,2.16
F.Paste:
  region: 1.475,-0.821 1.475,-1.379 1.379,-1.475 0.821,-1.475 0.725,-1.379 0.725,-0.821 0.821,-0.725 1.379,-0.725
  region: 0.375,-0.821 0.375,-1.379 0.279,-1.475 -0.279,-1.475 -0.375,-1.379 -0.375,-0.821 -0.279,-0.725 0.279,-0.725
  region: 1.475,0.279 1.475,-0.279 1.379,-0.375 0.821,-0.375 0.725,-0.279 0.725,0.279 0.821,0.375 1.379,0.375
  region: 1.475,1.379 1.475,0.821 1.379,0.725 0.821,0.725 0.725,0.821 0.725,1.379 0.821,1.475 1.379,1.475
  region: -0.725,1.379 -0.725,0.821 -0.821,0.725 -1.379,0.725 -1.475,0.821 -1.475,1.379 -1.379,1.475 -0.821,1.475
  region: 0.375,1.379 0.375,0.821 0.279,0.725 -0.279,0.725 -0.375,0.821 -0.375,1.379 -0.279,1.475 0.279,1.475
  region: -0.725,0.279 -0.725,-0.279 -0.821,-0.375 -1.379,-0.375 -1.475,-0.279 -1.475,0.279 -1.379,0.375 -0.821,0.375
  region: -0.725,-0.821 -0.725,-1.379 -0.821,-1.475 -1.379,-1.475 -1.475,-1.379 -1.475,-0.821 -1.379,-0.725 -0.821,-0.725
  region: 0.375,0.279 0.375,-0.279 0.279,-0.375 -0.279,-0.375 -0.375,-0.279 -0.375,0.279 -0.279,0.375 0.279,0.375
F.CrtYd:
  lines w0.05: -3.12,-3.12 3.12,-3.12 3.12,3.12 -3.12,3.12 -3.12,-3.12
F.Fab:
  lines w0.1: -2.5,-2.5 2.5,-2.5 2.5,2.5 -1.5,2.5 -2.5,1.5 -2.5,-2.5
  text "'.Designator'" at -4.047,-0.84 h1

## QFN-40-1EP_6x6mm_P0.5mm_EP4.6x4.6mm [mm]
pads (57):
  rrect25% 0.825x0.25 smd: 1(-2.937,2.25) 2(-2.937,1.75) 3(-2.937,1.25) 4(-2.937,0.75) 5(-2.937,0.25) 6(-2.937,-0.25) 7(-2.937,-0.75) 8(-2.937,-1.25) 9(-2.937,-1.75) 10(-2.937,-2.25) 21(2.937,-2.25) 22(2.937,-1.75) 23(2.937,-1.25) 24(2.937,-0.75) 25(2.937,-0.25) 26(2.937,0.25) 27(2.937,0.75) 28(2.937,1.25) 29(2.937,1.75) 30(2.937,2.25)
  rrect25% 0.25x0.825 smd: 11(-2.25,-2.937) 12(-1.75,-2.937) 13(-1.25,-2.937) 14(-0.75,-2.937) 15(-0.25,-2.937) 16(0.25,-2.937) 17(0.75,-2.937) 18(1.25,-2.937) 19(1.75,-2.937) 20(2.25,-2.937) 31(2.25,2.937) 32(1.75,2.937) 33(1.25,2.937) 34(0.75,2.937) 35(0.25,2.937) 36(-0.25,2.937) 37(-0.75,2.937) 38(-1.25,2.937) 39(-1.75,2.937) 40(-2.25,2.937)
  rect 4.6x4.6 smd: 41(0,0)
  rrect25% 0.93x0.93 on Top Paste: Un1(-0.575,-0.575) Un2(-1.725,-1.725) Un3(1.725,0.575) Un4(-0.575,-1.725) Un5(-0.575,1.725) Un6(-0.575,0.575) Un7(0.575,1.725) Un8(-1.725,1.725) Un9(1.725,-1.725) Un10(0.575,0.575) Un11(1.725,1.725) Un12(0.575,-0.575) Un13(-1.725,0.575) Un14(0.575,-1.725) Un15(1.725,-0.575) Un16(-1.725,-0.575)
F.SilkS:
  lines w0.12: -3.11,-2.635 -3.11,-3.11 -2.635,-3.11 ; -3.11,3.11 -2.635,3.11 ; 2.635,-3.11 3.11,-3.11 3.11,-2.635 ; 2.635,3.11 3.11,3.11 3.11,2.635
F.CrtYd:
  lines w0.05: -3.6,-3.6 3.6,-3.6 3.6,3.6 -3.6,3.6 -3.6,-3.6
F.Fab:
  lines w0.1: -3,-3 3,-3 3,3 -2,3 -3,2 -3,-3
  text "'.Designator'" at -4.047,-0.84 h1

## QFN-40-1EP_6x6mm_P0.5mm_EP4.6x4.6mm_ThermalVias [mm]
pads (83):
  rrect25% 0.825x0.25 smd: 1(-2.937,2.25) 2(-2.937,1.75) 3(-2.937,1.25) 4(-2.937,0.75) 5(-2.937,0.25) 6(-2.937,-0.25) 7(-2.937,-0.75) 8(-2.937,-1.25) 9(-2.937,-1.75) 10(-2.937,-2.25) 21(2.937,-2.25) 22(2.937,-1.75) 23(2.937,-1.25) 24(2.937,-0.75) 25(2.937,-0.25) 26(2.937,0.25) 27(2.937,0.75) 28(2.937,1.25) 29(2.937,1.75) 30(2.937,2.25)
  rrect25% 0.25x0.825 smd: 11(-2.25,-2.937) 12(-1.75,-2.937) 13(-1.25,-2.937) 14(-0.75,-2.937) 15(-0.25,-2.937) 16(0.25,-2.937) 17(0.75,-2.937) 18(1.25,-2.937) 19(1.75,-2.937) 20(2.25,-2.937) 31(2.25,2.937) 32(1.75,2.937) 33(1.25,2.937) 34(0.75,2.937) 35(0.25,2.937) 36(-0.25,2.937) 37(-0.75,2.937) 38(-1.25,2.937) 39(-1.75,2.937) 40(-2.25,2.937)
  round 0.5 hole 0.2: 41(-2.05,-2.05) 41(-2.05,-1.025) 41(-2.05,0) 41(-2.05,1.025) 41(-2.05,2.05) 41(-1.025,-2.05) 41(-1.025,-1.025) 41(-1.025,0) 41(-1.025,1.025) 41(-1.025,2.05) 41(0,-2.05) 41(0,-1.025) 41(0,0) 41(0,1.025) 41(0,2.05) 41(1.025,-2.05) 41(1.025,-1.025) 41(1.025,0) 41(1.025,1.025) 41(1.025,2.05) 41(2.05,-2.05) 41(2.05,-1.025) 41(2.05,0) 41(2.05,1.025) 41(2.05,2.05)
  rect 4.6x4.6 smd: 41(0,0)
  rect 4.6x4.6 smd far side: 41(0,0)
  round 0.786 on Top Paste: Un1(0.513,0.513) Un2(1.538,1.538) Un3(-0.513,0.513) Un4(-1.538,1.538) Un5(0.513,-1.538) Un6(1.538,-1.538) Un7(-1.538,0.513) Un8(-1.538,-1.538) Un9(1.538,0.513) Un10(0.513,-0.513) Un11(-0.513,1.538) Un12(-0.513,-1.538) Un13(1.538,-0.513) Un14(-1.538,-0.513) Un15(-0.513,-0.513) Un16(0.513,1.538)
F.SilkS:
  lines w0.12: -3.11,-2.635 -3.11,-3.11 -2.635,-3.11 ; -3.11,3.11 -2.635,3.11 ; 2.635,-3.11 3.11,-3.11 3.11,-2.635 ; 2.635,3.11 3.11,3.11 3.11,2.635
F.Paste:
  region: 0.853,0.766 0.853,0.259 0.766,0.172 0.259,0.172 0.172,0.259 0.172,0.766 0.259,0.853 0.766,0.853
  region: 1.878,1.791 1.878,1.284 1.791,1.197 1.284,1.197 1.197,1.284 1.197,1.791 1.284,1.878 1.791,1.878
  region: -0.172,0.766 -0.172,0.259 -0.259,0.172 -0.766,0.172 -0.853,0.259 -0.853,0.766 -0.766,0.853 -0.259,0.853
  region: -1.197,1.791 -1.197,1.284 -1.284,1.197 -1.791,1.197 -1.878,1.284 -1.878,1.791 -1.791,1.878 -1.284,1.878
  region: 0.853,-1.284 0.853,-1.791 0.766,-1.878 0.259,-1.878 0.172,-1.791 0.172,-1.284 0.259,-1.197 0.766,-1.197
  region: 1.878,-1.284 1.878,-1.791 1.791,-1.878 1.284,-1.878 1.197,-1.791 1.197,-1.284 1.284,-1.197 1.791,-1.197
  region: -1.197,0.766 -1.197,0.259 -1.284,0.172 -1.791,0.172 -1.878,0.259 -1.878,0.766 -1.791,0.853 -1.284,0.853
  region: -1.197,-1.284 -1.197,-1.791 -1.284,-1.878 -1.791,-1.878 -1.878,-1.791 -1.878,-1.284 -1.791,-1.197 -1.284,-1.197
  region: 1.878,0.766 1.878,0.259 1.791,0.172 1.284,0.172 1.197,0.259 1.197,0.766 1.284,0.853 1.791,0.853
  region: 0.853,-0.259 0.853,-0.766 0.766,-0.853 0.259,-0.853 0.172,-0.766 0.172,-0.259 0.259,-0.172 0.766,-0.172
  region: -0.172,1.791 -0.172,1.284 -0.259,1.197 -0.766,1.197 -0.853,1.284 -0.853,1.791 -0.766,1.878 -0.259,1.878
  region: -0.172,-1.284 -0.172,-1.791 -0.259,-1.878 -0.766,-1.878 -0.853,-1.791 -0.853,-1.284 -0.766,-1.197 -0.259,-1.197
  region: 1.878,-0.259 1.878,-0.766 1.791,-0.853 1.284,-0.853 1.197,-0.766 1.197,-0.259 1.284,-0.172 1.791,-0.172
  region: -1.197,-0.259 -1.197,-0.766 -1.284,-0.853 -1.791,-0.853 -1.878,-0.766 -1.878,-0.259 -1.791,-0.172 -1.284,-0.172
  region: -0.172,-0.259 -0.172,-0.766 -0.259,-0.853 -0.766,-0.853 -0.853,-0.766 -0.853,-0.259 -0.766,-0.172 -0.259,-0.172
  region: 0.853,1.791 0.853,1.284 0.766,1.197 0.259,1.197 0.172,1.284 0.172,1.791 0.259,1.878 0.766,1.878
F.CrtYd:
  lines w0.05: -3.6,-3.6 -3.6,3.6 3.6,3.6 3.6,-3.6 -3.6,-3.6
F.Fab:
  lines w0.1: -3,-3 -3,2 -2,3 3,3 3,-3 -3,-3
  text "'.Designator'" at -4.047,-0.84 h1